# Altium schematic symbol library jlcpcb_2025_04_capacitors_extended_0402.schlib: 3594 symbols (part 19 of 20) (continued)
## TCC0402X7R223M250AT
designator C?  Capacitance: 22000pF  (hidden comment: *)
Capacitor, Ceramic (MLCC), 22000pF, ±20%, 25V, X7R, ±20%, SMD 0402; Manufacturer: CCTC; Manufacturer Part Number: TCC0402X7R223M250AT; Package Size: 0402; JLCPCB Basic Part: No; JLCPCB Part Number: C5142570; Supplier 1: LCSC; Category: Capacitors - MLCC; Supplier Part Number 1: C5142570; Tolerance: ±20%; Voltage Rating: 25V; Temperature Coefficient: X7R; RoHS: Yes; ComponentLink1Description: Datasheet; ComponentLink1URL: https://wmsc.lcsc.com/wmsc/upload/file/pdf/v2/lcsc/2209011730_CCTC-TCC0402X7R223M250AT_C5142570.pdf; ComponentLink2Description: JLCPCB Part URL; ComponentLink2URL: https://jlcpcb.com/partdetail/C5142570; ComponentLink3Description: LCSC Part URL; ComponentLink3URL: https://lcsc.com/product-detail/Multilayer-Ceramic-Capacitors-MLCC---SMD-SMT_CCTC-CCTC-TCC0402X7R223M250AT_C5142570.html
footprint CAP-0402 (0402 (1005M) Capacitor)
pins: 1, 2

## TCC0402X7R224K160AT
designator C?  Capacitance: 220nF  (hidden comment: *)
Capacitor, Ceramic (MLCC), 220nF, ±10%, 16V, X7R, ±10%, SMD 0402; Manufacturer: CCTC; Manufacturer Part Number: TCC0402X7R224K160AT; Package Size: 0402; JLCPCB Basic Part: No; JLCPCB Part Number: C696846; Supplier 1: LCSC; Category: Capacitors - MLCC; Supplier Part Number 1: C696846; Tolerance: ±10%; Voltage Rating: 16V; Temperature Coefficient: X7R; RoHS: Yes; ComponentLink1Description: Datasheet; ComponentLink1URL: https://wmsc.lcsc.com/wmsc/upload/file/pdf/v2/lcsc/2304140030_CCTC-TCC0402X7R224K160AT_C696846.pdf; ComponentLink2Description: JLCPCB Part URL; ComponentLink2URL: https://jlcpcb.com/partdetail/C696846; ComponentLink3Description: LCSC Part URL; ComponentLink3URL: https://lcsc.com/product-detail/Multilayer-Ceramic-Capacitors-MLCC---SMD-SMT_CCTC-CCTC-TCC0402X7R224K160AT_C696846.html
footprint CAP-0402 (0402 (1005M) Capacitor)
pins: 1, 2

## TCC0402X7R224K250AT
designator C?  Capacitance: 220000pF  (hidden comment: *)
Capacitor, Ceramic (MLCC), 220000pF, ±10%, 25V, X7R, ±10%, SMD 0402; Manufacturer: CCTC; Manufacturer Part Number: TCC0402X7R224K250AT; Package Size: 0402; JLCPCB Basic Part: No; JLCPCB Part Number: C915854; Supplier 1: LCSC; Category: Capacitors - MLCC; Supplier Part Number 1: C915854; Tolerance: ±10%; Voltage Rating: 25V; Temperature Coefficient: X7R; RoHS: Yes; ComponentLink1Description: Datasheet; ComponentLink1URL: https://wmsc.lcsc.com/wmsc/upload/file/pdf/v2/lcsc/2304140030_CCTC-TCC0402X7R224K250AT_C915854.pdf; ComponentLink2Description: JLCPCB Part URL; ComponentLink2URL: https://jlcpcb.com/partdetail/C915854; ComponentLink3Description: LCSC Part URL; ComponentLink3URL: https://lcsc.com/product-detail/Multilayer-Ceramic-Capacitors-MLCC---SMD-SMT_CCTC-CCTC-TCC0402X7R224K250AT_C915854.html
footprint CAP-0402 (0402 (1005M) Capacitor)
pins: 1, 2

## TCC0402X7R224M160AT
designator C?  Capacitance: 220nF  (hidden comment: *)
Capacitor, Ceramic (MLCC), 220nF, ±20%, 16V, X7R, ±20%, SMD 0402; Manufacturer: CCTC; Manufacturer Part Number: TCC0402X7R224M160AT; Package Size: 0402; JLCPCB Basic Part: No; JLCPCB Part Number: C2903665; Supplier 1: LCSC; Category: Capacitors - MLCC; Supplier Part Number 1: C2903665; Tolerance: ±20%; Voltage Rating: 16V; Temperature Coefficient: X7R; RoHS: Yes; ComponentLink1Description: Datasheet; ComponentLink1URL: https://wmsc.lcsc.com/wmsc/upload/file/pdf/v2/lcsc/2110101130_CCTC-TCC0402X7R224M160AT_C2903665.pdf; ComponentLink2Description: JLCPCB Part URL; ComponentLink2URL: https://jlcpcb.com/partdetail/C2903665; ComponentLink3Description: LCSC Part URL; ComponentLink3URL: https://lcsc.com/product-detail/Multilayer-Ceramic-Capacitors-MLCC---SMD-SMT_CCTC-CCTC-TCC0402X7R224M160AT_C2903665.html
footprint CAP-0402 (0402 (1005M) Capacitor)
pins: 1, 2

## TCC0402X7R271K500AT
designator C?  Capacitance: 270pF  (hidden comment: *)
Capacitor, Ceramic (MLCC), 270pF, ±10%, 50V, X7R, ±10%, SMD 0402; Manufacturer: CCTC; Manufacturer Part Number: TCC0402X7R271K500AT; Package Size: 0402; JLCPCB Basic Part: No; JLCPCB Part Number: C880627; Supplier 1: LCSC; Category: Capacitors - MLCC; Supplier Part Number 1: C880627; Tolerance: ±10%; Voltage Rating: 50V; Temperature Coefficient: X7R; RoHS: Yes; ComponentLink1Description: Datasheet; ComponentLink1URL: https://wmsc.lcsc.com/wmsc/upload/file/pdf/v2/lcsc/2304140030_CCTC-TCC0402X7R271K500AT_C880627.pdf; ComponentLink2Description: JLCPCB Part URL; ComponentLink2URL: https://jlcpcb.com/partdetail/C880627; ComponentLink3Description: LCSC Part URL; ComponentLink3URL: https://lcsc.com/product-detail/Multilayer-Ceramic-Capacitors-MLCC---SMD-SMT_CCTC-CCTC-TCC0402X7R271K500AT_C880627.html
footprint CAP-0402 (0402 (1005M) Capacitor)
pins: 1, 2

## TCC0402X7R272K500AT
designator C?  Capacitance: 2.7nF  (hidden comment: *)
Capacitor, Ceramic (MLCC), 2.7nF, ±10%, 50V, X7R, ±10%, SMD 0402; Manufacturer: CCTC; Manufacturer Part Number: TCC0402X7R272K500AT; Package Size: 0402; JLCPCB Basic Part: No; JLCPCB Part Number: C5448825; Supplier 1: LCSC; Category: Capacitors - MLCC; Supplier Part Number 1: C5448825; Tolerance: ±10%; Voltage Rating: 50V; Temperature Coefficient: X7R; RoHS: Yes; ComponentLink1Description: Datasheet; ComponentLink1URL: https://wmsc.lcsc.com/wmsc/upload/file/pdf/v2/lcsc/2403281711_CCTC-TCC0402X7R272K500AT_C5448825.pdf; ComponentLink2Description: JLCPCB Part URL; ComponentLink2URL: https://jlcpcb.com/partdetail/C5448825; ComponentLink3Description: LCSC Part URL; ComponentLink3URL: https://lcsc.com/product-detail/Multilayer-Ceramic-Capacitors-MLCC---SMD-SMT_CCTC-CCTC-TCC0402X7R272K500AT_C5448825.html
footprint CAP-0402 (0402 (1005M) Capacitor)
pins: 1, 2

## TCC0402X7R273K500AT
designator C?  Capacitance: 27000pF  (hidden comment: *)
Capacitor, Ceramic (MLCC), 27000pF, ±10%, 50V, X7R, ±10%, SMD 0402; Manufacturer: CCTC; Manufacturer Part Number: TCC0402X7R273K500AT; Package Size: 0402; JLCPCB Basic Part: No; JLCPCB Part Number: C880636; Supplier 1: LCSC; Category: Capacitors - MLCC; Supplier Part Number 1: C880636; Tolerance: ±10%; Voltage Rating: 50V; Temperature Coefficient: X7R; RoHS: Yes; ComponentLink1Description: Datasheet; ComponentLink1URL: https://wmsc.lcsc.com/wmsc/upload/file/pdf/v2/lcsc/2304140030_CCTC-TCC0402X7R273K500AT_C880636.pdf; ComponentLink2Description: JLCPCB Part URL; ComponentLink2URL: https://jlcpcb.com/partdetail/C880636; ComponentLink3Description: LCSC Part URL; ComponentLink3URL: https://lcsc.com/product-detail/Multilayer-Ceramic-Capacitors-MLCC---SMD-SMT_CCTC-CCTC-TCC0402X7R273K500AT_C880636.html
footprint CAP-0402 (0402 (1005M) Capacitor)
pins: 1, 2

## TCC0402X7R331K500AT
designator C?  Capacitance: 330pF  (hidden comment: *)
Capacitor, Ceramic (MLCC), 330pF, ±10%, 50V, X7R, ±10%, SMD 0402; Manufacturer: CCTC; Manufacturer Part Number: TCC0402X7R331K500AT; Package Size: 0402; JLCPCB Basic Part: No; JLCPCB Part Number: C696848; Supplier 1: LCSC; Category: Capacitors - MLCC; Supplier Part Number 1: C696848; Tolerance: ±10%; Voltage Rating: 50V; Temperature Coefficient: X7R; RoHS: Yes; ComponentLink1Description: Datasheet; ComponentLink1URL: https://wmsc.lcsc.com/wmsc/upload/file/pdf/v2/lcsc/2304140030_CCTC-TCC0402X7R331K500AT_C696848.pdf; ComponentLink2Description: JLCPCB Part URL; ComponentLink2URL: https://jlcpcb.com/partdetail/C696848; ComponentLink3Description: LCSC Part URL; ComponentLink3URL: https://lcsc.com/product-detail/Multilayer-Ceramic-Capacitors-MLCC---SMD-SMT_CCTC-CCTC-TCC0402X7R331K500AT_C696848.html
footprint CAP-0402 (0402 (1005M) Capacitor)
pins: 1, 2

## TCC0402X7R332K500AT
designator C?  Capacitance: 3.3nF  (hidden comment: *)
Capacitor, Ceramic (MLCC), 3.3nF, ±10%, 50V, X7R, ±10%, SMD 0402; Manufacturer: CCTC; Manufacturer Part Number: TCC0402X7R332K500AT; Package Size: 0402; JLCPCB Basic Part: No; JLCPCB Part Number: C696855; Supplier 1: LCSC; Category: Capacitors - MLCC; Supplier Part Number 1: C696855; Tolerance: ±10%; Voltage Rating: 50V; Temperature Coefficient: X7R; RoHS: Yes; ComponentLink1Description: Datasheet; ComponentLink1URL: https://wmsc.lcsc.com/wmsc/upload/file/pdf/v2/lcsc/2304140030_CCTC-TCC0402X7R332K500AT_C696855.pdf; ComponentLink2Description: JLCPCB Part URL; ComponentLink2URL: https://jlcpcb.com/partdetail/C696855; ComponentLink3Description: LCSC Part URL; ComponentLink3URL: https://lcsc.com/product-detail/Multilayer-Ceramic-Capacitors-MLCC---SMD-SMT_CCTC-CCTC-TCC0402X7R332K500AT_C696855.html
footprint CAP-0402 (0402 (1005M) Capacitor)
pins: 1, 2

## TCC0402X7R333K250AT
designator C?  Capacitance: 33nF  (hidden comment: *)
Capacitor, Ceramic (MLCC), 33nF, ±10%, 25V, X7R, ±10%, SMD 0402; Manufacturer: CCTC; Manufacturer Part Number: TCC0402X7R333K250AT; Package Size: 0402; JLCPCB Basic Part: No; JLCPCB Part Number: C466238; Supplier 1: LCSC; Category: Capacitors - MLCC; Supplier Part Number 1: C466238; Tolerance: ±10%; Voltage Rating: 25V; Temperature Coefficient: X7R; RoHS: Yes; ComponentLink1Description: Datasheet; ComponentLink1URL: https://wmsc.lcsc.com/wmsc/upload/file/pdf/v2/lcsc/2304140030_CCTC-TCC0402X7R333K250AT_C466238.pdf; ComponentLink2Description: JLCPCB Part URL; ComponentLink2URL: https://jlcpcb.com/partdetail/C466238; ComponentLink3Description: LCSC Part URL; ComponentLink3URL: https://lcsc.com/product-detail/Multilayer-Ceramic-Capacitors-MLCC---SMD-SMT_CCTC-CCTC-TCC0402X7R333K250AT_C466238.html
footprint CAP-0402 (0402 (1005M) Capacitor)
pins: 1, 2

## TCC0402X7R333K500AT
designator C?  Capacitance: 33000pF  (hidden comment: *)
Capacitor, Ceramic (MLCC), 33000pF, ±10%, 50V, X7R, ±10%, SMD 0402; Manufacturer: CCTC; Manufacturer Part Number: TCC0402X7R333K500AT; Package Size: 0402; JLCPCB Basic Part: No; JLCPCB Part Number: C880608; Supplier 1: LCSC; Category: Capacitors - MLCC; Supplier Part Number 1: C880608; Tolerance: ±10%; Voltage Rating: 50V; Temperature Coefficient: X7R; RoHS: Yes; ComponentLink1Description: Datasheet; ComponentLink1URL: https://wmsc.lcsc.com/wmsc/upload/file/pdf/v2/lcsc/2304140030_CCTC-TCC0402X7R333K500AT_C880608.pdf; ComponentLink2Description: JLCPCB Part URL; ComponentLink2URL: https://jlcpcb.com/partdetail/C880608; ComponentLink3Description: LCSC Part URL; ComponentLink3URL: https://lcsc.com/product-detail/Multilayer-Ceramic-Capacitors-MLCC---SMD-SMT_CCTC-CCTC-TCC0402X7R333K500AT_C880608.html
footprint CAP-0402 (0402 (1005M) Capacitor)
pins: 1, 2

## TCC0402X7R333M250AT
designator C?  Capacitance: 33nF  (hidden comment: *)
Capacitor, Ceramic (MLCC), 33nF, ±20%, 25V, X7R, ±20%, SMD 0402; Manufacturer: CCTC; Manufacturer Part Number: TCC0402X7R333M250AT; Package Size: 0402; JLCPCB Basic Part: No; JLCPCB Part Number: C6266888; Supplier 1: LCSC; Category: Capacitors - MLCC; Supplier Part Number 1: C6266888; Tolerance: ±20%; Voltage Rating: 25V; Temperature Coefficient: X7R; RoHS: Yes; ComponentLink1Description: Datasheet; ComponentLink1URL: https://wmsc.lcsc.com/wmsc/upload/file/pdf/v2/lcsc/2305171520_CCTC-TCC0402X7R333M250AT_C6266888.pdf; ComponentLink2Description: JLCPCB Part URL; ComponentLink2URL: https://jlcpcb.com/partdetail/C6266888; ComponentLink3Description: LCSC Part URL; ComponentLink3URL: https://lcsc.com/product-detail/Multilayer-Ceramic-Capacitors-MLCC---SMD-SMT_CCTC-CCTC-TCC0402X7R333M250AT_C6266888.html
footprint CAP-0402 (0402 (1005M) Capacitor)
pins: 1, 2

## TCC0402X7R361K500AT
designator C?  Capacitance: 360pF  (hidden comment: *)
Capacitor, Ceramic (MLCC), 360pF, ±10%, 50V, X7R, ±10%, SMD 0402; Manufacturer: CCTC; Manufacturer Part Number: TCC0402X7R361K500AT; Package Size: 0402; JLCPCB Basic Part: No; JLCPCB Part Number: C7393871; Supplier 1: LCSC; Category: Capacitors - MLCC; Supplier Part Number 1: C7393871; Tolerance: ±10%; Voltage Rating: 50V; Temperature Coefficient: X7R; RoHS: Yes; ComponentLink1Description: Datasheet; ComponentLink1URL: https://wmsc.lcsc.com/wmsc/upload/file/pdf/v2/lcsc/2306211554_CCTC-TCC0402X7R361K500AT_C7393871.pdf; ComponentLink2Description: JLCPCB Part URL; ComponentLink2URL: https://jlcpcb.com/partdetail/C7393871; ComponentLink3Description: LCSC Part URL; ComponentLink3URL: https://lcsc.com/product-detail/Multilayer-Ceramic-Capacitors-MLCC---SMD-SMT_CCTC-CCTC-TCC0402X7R361K500AT_C7393871.html
footprint CAP-0402 (0402 (1005M) Capacitor)
pins: 1, 2

## TCC0402X7R391K500AT
designator C?  Capacitance: 390pF  (hidden comment: *)
Capacitor, Ceramic (MLCC), 390pF, ±10%, 50V, X7R, ±10%, SMD 0402; Manufacturer: CCTC; Manufacturer Part Number: TCC0402X7R391K500AT; Package Size: 0402; JLCPCB Basic Part: No; JLCPCB Part Number: C696902; Supplier 1: LCSC; Category: Capacitors - MLCC; Supplier Part Number 1: C696902; Tolerance: ±10%; Voltage Rating: 50V; Temperature Coefficient: X7R; RoHS: Yes; ComponentLink1Description: Datasheet; ComponentLink1URL: https://wmsc.lcsc.com/wmsc/upload/file/pdf/v2/lcsc/2304140030_CCTC-TCC0402X7R391K500AT_C696902.pdf; ComponentLink2Description: JLCPCB Part URL; ComponentLink2URL: https://jlcpcb.com/partdetail/C696902; ComponentLink3Description: LCSC Part URL; ComponentLink3URL: https://lcsc.com/product-detail/Multilayer-Ceramic-Capacitors-MLCC---SMD-SMT_CCTC-CCTC-TCC0402X7R391K500AT_C696902.html
footprint CAP-0402 (0402 (1005M) Capacitor)
pins: 1, 2

## TCC0402X7R392K500AT
designator C?  Capacitance: 3900pF  (hidden comment: *)
Capacitor, Ceramic (MLCC), 3900pF, ±10%, 50V, X7R, ±10%, SMD 0402; Manufacturer: CCTC; Manufacturer Part Number: TCC0402X7R392K500AT; Package Size: 0402; JLCPCB Basic Part: No; JLCPCB Part Number: C880632; Supplier 1: LCSC; Category: Capacitors - MLCC; Supplier Part Number 1: C880632; Tolerance: ±10%; Voltage Rating: 50V; Temperature Coefficient: X7R; RoHS: Yes; ComponentLink1Description: Datasheet; ComponentLink1URL: https://wmsc.lcsc.com/wmsc/upload/file/pdf/v2/lcsc/2304140030_CCTC-TCC0402X7R392K500AT_C880632.pdf; ComponentLink2Description: JLCPCB Part URL; ComponentLink2URL: https://jlcpcb.com/partdetail/C880632; ComponentLink3Description: LCSC Part URL; ComponentLink3URL: https://lcsc.com/product-detail/Multilayer-Ceramic-Capacitors-MLCC---SMD-SMT_CCTC-CCTC-TCC0402X7R392K500AT_C880632.html
footprint CAP-0402 (0402 (1005M) Capacitor)
pins: 1, 2

## TCC0402X7R393K500AT
designator C?  Capacitance: 39nF  (hidden comment: *)
Capacitor, Ceramic (MLCC), 39nF, ±10%, 50V, X7R, ±10%, SMD 0402; Manufacturer: CCTC; Manufacturer Part Number: TCC0402X7R393K500AT; Package Size: 0402; JLCPCB Basic Part: No; JLCPCB Part Number: C880624; Supplier 1: LCSC; Category: Capacitors - MLCC; Supplier Part Number 1: C880624; Tolerance: ±10%; Voltage Rating: 50V; Temperature Coefficient: X7R; RoHS: Yes; ComponentLink1Description: Datasheet; ComponentLink1URL: https://wmsc.lcsc.com/wmsc/upload/file/pdf/v2/lcsc/2304140030_CCTC-TCC0402X7R393K500AT_C880624.pdf; ComponentLink2Description: JLCPCB Part URL; ComponentLink2URL: https://jlcpcb.com/partdetail/C880624; ComponentLink3Description: LCSC Part URL; ComponentLink3URL: https://lcsc.com/product-detail/Multilayer-Ceramic-Capacitors-MLCC---SMD-SMT_CCTC-CCTC-TCC0402X7R393K500AT_C880624.html
footprint CAP-0402 (0402 (1005M) Capacitor)
pins: 1, 2

## TCC0402X7R471K500AT
designator C?  Capacitance: 470pF  (hidden comment: *)
Capacitor, Ceramic (MLCC), 470pF, ±10%, 50V, X7R, ±10%, SMD 0402; Manufacturer: CCTC; Manufacturer Part Number: TCC0402X7R471K500AT; Package Size: 0402; JLCPCB Basic Part: No; JLCPCB Part Number: C696858; Supplier 1: LCSC; Category: Capacitors - MLCC; Supplier Part Number 1: C696858; Tolerance: ±10%; Voltage Rating: 50V; Temperature Coefficient: X7R; RoHS: Yes; ComponentLink1Description: Datasheet; ComponentLink1URL: https://wmsc.lcsc.com/wmsc/upload/file/pdf/v2/lcsc/2304140030_CCTC-TCC0402X7R471K500AT_C696858.pdf; ComponentLink2Description: JLCPCB Part URL; ComponentLink2URL: https://jlcpcb.com/partdetail/C696858; ComponentLink3Description: LCSC Part URL; ComponentLink3URL: https://lcsc.com/product-detail/Multilayer-Ceramic-Capacitors-MLCC---SMD-SMT_CCTC-CCTC-TCC0402X7R471K500AT_C696858.html
footprint CAP-0402 (0402 (1005M) Capacitor)
pins: 1, 2

## TCC0402X7R472K500AT
designator C?  Capacitance: 4.7nF  (hidden comment: *)
Capacitor, Ceramic (MLCC), 4.7nF, ±10%, 50V, X7R, ±10%, SMD 0402; Manufacturer: CCTC; Manufacturer Part Number: TCC0402X7R472K500AT; Package Size: 0402; JLCPCB Basic Part: No; JLCPCB Part Number: C696917; Supplier 1: LCSC; Category: Capacitors - MLCC; Supplier Part Number 1: C696917; Tolerance: ±10%; Voltage Rating: 50V; Temperature Coefficient: X7R; RoHS: Yes; ComponentLink1Description: Datasheet; ComponentLink1URL: https://wmsc.lcsc.com/wmsc/upload/file/pdf/v2/lcsc/2304140030_CCTC-TCC0402X7R472K500AT_C696917.pdf; ComponentLink2Description: JLCPCB Part URL; ComponentLink2URL: https://jlcpcb.com/partdetail/C696917; ComponentLink3Description: LCSC Part URL; ComponentLink3URL: https://lcsc.com/product-detail/Multilayer-Ceramic-Capacitors-MLCC---SMD-SMT_CCTC-CCTC-TCC0402X7R472K500AT_C696917.html
footprint CAP-0402 (0402 (1005M) Capacitor)
pins: 1, 2

## TCC0402X7R473K160AT
designator C?  Capacitance: 47nF  (hidden comment: *)
Capacitor, Ceramic (MLCC), 47nF, ±10%, 16V, X7R, ±10%, SMD 0402; Manufacturer: CCTC; Manufacturer Part Number: TCC0402X7R473K160AT; Package Size: 0402; JLCPCB Basic Part: No; JLCPCB Part Number: C380307; Supplier 1: LCSC; Category: Capacitors - MLCC; Supplier Part Number 1: C380307; Tolerance: ±10%; Voltage Rating: 16V; Temperature Coefficient: X7R; RoHS: Yes; ComponentLink1Description: Datasheet; ComponentLink1URL: https://wmsc.lcsc.com/wmsc/upload/file/pdf/v2/lcsc/2304140030_CCTC-TCC0402X7R473K160AT_C380307.pdf; ComponentLink2Description: JLCPCB Part URL; ComponentLink2URL: https://jlcpcb.com/partdetail/C380307; ComponentLink3Description: LCSC Part URL; ComponentLink3URL: https://lcsc.com/product-detail/Multilayer-Ceramic-Capacitors-MLCC---SMD-SMT_CCTC-CCTC-TCC0402X7R473K160AT_C380307.html
footprint CAP-0402 (0402 (1005M) Capacitor)
pins: 1, 2

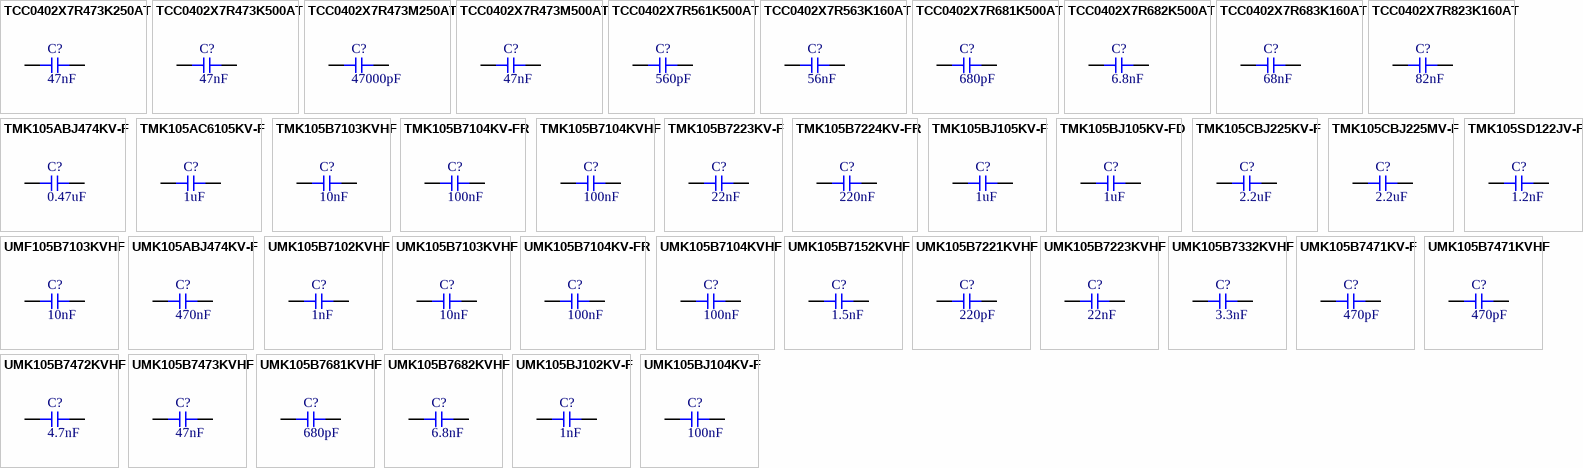
[diagram p85: symbols TCC0402X7R473K250AT to UMK105BJ104KV-F]

## TCC0402X7R473K250AT
designator C?  Capacitance: 47nF  (hidden comment: *)
Capacitor, Ceramic (MLCC), 47nF, ±10%, 25V, X7R, ±10%, SMD 0402; Manufacturer: CCTC; Manufacturer Part Number: TCC0402X7R473K250AT; Package Size: 0402; JLCPCB Basic Part: No; JLCPCB Part Number: C466239; Supplier 1: LCSC; Category: Capacitors - MLCC; Supplier Part Number 1: C466239; Tolerance: ±10%; Voltage Rating: 25V; Temperature Coefficient: X7R; RoHS: Yes; ComponentLink1Description: Datasheet; ComponentLink1URL: https://wmsc.lcsc.com/wmsc/upload/file/pdf/v2/lcsc/2304140030_CCTC-TCC0402X7R473K250AT_C466239.pdf; ComponentLink2Description: JLCPCB Part URL; ComponentLink2URL: https://jlcpcb.com/partdetail/C466239; ComponentLink3Description: LCSC Part URL; ComponentLink3URL: https://lcsc.com/product-detail/Multilayer-Ceramic-Capacitors-MLCC---SMD-SMT_CCTC-CCTC-TCC0402X7R473K250AT_C466239.html
footprint CAP-0402 (0402 (1005M) Capacitor)
pins: 1, 2

## TCC0402X7R473K500AT
designator C?  Capacitance: 47nF  (hidden comment: *)
Capacitor, Ceramic (MLCC), 47nF, ±10%, 50V, X7R, ±10%, SMD 0402; Manufacturer: CCTC; Manufacturer Part Number: TCC0402X7R473K500AT; Package Size: 0402; JLCPCB Basic Part: No; JLCPCB Part Number: C880605; Supplier 1: LCSC; Category: Capacitors - MLCC; Supplier Part Number 1: C880605; Tolerance: ±10%; Voltage Rating: 50V; Temperature Coefficient: X7R; RoHS: Yes; ComponentLink1Description: Datasheet; ComponentLink1URL: https://wmsc.lcsc.com/wmsc/upload/file/pdf/v2/lcsc/2304140030_CCTC-TCC0402X7R473K500AT_C880605.pdf; ComponentLink2Description: JLCPCB Part URL; ComponentLink2URL: https://jlcpcb.com/partdetail/C880605; ComponentLink3Description: LCSC Part URL; ComponentLink3URL: https://lcsc.com/product-detail/Multilayer-Ceramic-Capacitors-MLCC---SMD-SMT_CCTC-CCTC-TCC0402X7R473K500AT_C880605.html
footprint CAP-0402 (0402 (1005M) Capacitor)
pins: 1, 2

## TCC0402X7R473M250AT
designator C?  Capacitance: 47000pF  (hidden comment: *)
Capacitor, Ceramic (MLCC), 47000pF, ±20%, 25V, X7R, ±20%, SMD 0402; Manufacturer: CCTC; Manufacturer Part Number: TCC0402X7R473M250AT; Package Size: 0402; JLCPCB Basic Part: No; JLCPCB Part Number: C5142571; Supplier 1: LCSC; Category: Capacitors - MLCC; Supplier Part Number 1: C5142571; Tolerance: ±20%; Voltage Rating: 25V; Temperature Coefficient: X7R; RoHS: Yes; ComponentLink1Description: Datasheet; ComponentLink1URL: https://wmsc.lcsc.com/wmsc/upload/file/pdf/v2/lcsc/2209011730_CCTC-TCC0402X7R473M250AT_C5142571.pdf; ComponentLink2Description: JLCPCB Part URL; ComponentLink2URL: https://jlcpcb.com/partdetail/C5142571; ComponentLink3Description: LCSC Part URL; ComponentLink3URL: https://lcsc.com/product-detail/Multilayer-Ceramic-Capacitors-MLCC---SMD-SMT_CCTC-CCTC-TCC0402X7R473M250AT_C5142571.html
footprint CAP-0402 (0402 (1005M) Capacitor)
pins: 1, 2

## TCC0402X7R473M500AT
designator C?  Capacitance: 47nF  (hidden comment: *)
Capacitor, Ceramic (MLCC), 47nF, ±20%, 50V, X7R, ±20%, SMD 0402; Manufacturer: CCTC; Manufacturer Part Number: TCC0402X7R473M500AT; Package Size: 0402; JLCPCB Basic Part: No; JLCPCB Part Number: C7393874; Supplier 1: LCSC; Category: Capacitors - MLCC; Supplier Part Number 1: C7393874; Tolerance: ±20%; Voltage Rating: 50V; Temperature Coefficient: X7R; RoHS: Yes; ComponentLink1Description: Datasheet; ComponentLink1URL: https://wmsc.lcsc.com/wmsc/upload/file/pdf/v2/lcsc/2306211554_CCTC-TCC0402X7R473M500AT_C7393874.pdf; ComponentLink2Description: JLCPCB Part URL; ComponentLink2URL: https://jlcpcb.com/partdetail/C7393874; ComponentLink3Description: LCSC Part URL; ComponentLink3URL: https://lcsc.com/product-detail/Multilayer-Ceramic-Capacitors-MLCC---SMD-SMT_CCTC-CCTC-TCC0402X7R473M500AT_C7393874.html
footprint CAP-0402 (0402 (1005M) Capacitor)
pins: 1, 2

## TCC0402X7R561K500AT
designator C?  Capacitance: 560pF  (hidden comment: *)
Capacitor, Ceramic (MLCC), 560pF, ±10%, 50V, X7R, ±10%, SMD 0402; Manufacturer: CCTC; Manufacturer Part Number: TCC0402X7R561K500AT; Package Size: 0402; JLCPCB Basic Part: No; JLCPCB Part Number: C5448816; Supplier 1: LCSC; Category: Capacitors - MLCC; Supplier Part Number 1: C5448816; Tolerance: ±10%; Voltage Rating: 50V; Temperature Coefficient: X7R; RoHS: Yes; ComponentLink1Description: Datasheet; ComponentLink1URL: https://wmsc.lcsc.com/wmsc/upload/file/pdf/v2/lcsc/2403281711_CCTC-TCC0402X7R561K500AT_C5448816.pdf; ComponentLink2Description: JLCPCB Part URL; ComponentLink2URL: https://jlcpcb.com/partdetail/C5448816; ComponentLink3Description: LCSC Part URL; ComponentLink3URL: https://lcsc.com/product-detail/Multilayer-Ceramic-Capacitors-MLCC---SMD-SMT_CCTC-CCTC-TCC0402X7R561K500AT_C5448816.html
footprint CAP-0402 (0402 (1005M) Capacitor)
pins: 1, 2

## TCC0402X7R563K160AT
designator C?  Capacitance: 56nF  (hidden comment: *)
Capacitor, Ceramic (MLCC), 56nF, ±10%, 16V, X7R, ±10%, SMD 0402; Manufacturer: CCTC; Manufacturer Part Number: TCC0402X7R563K160AT; Package Size: 0402; JLCPCB Basic Part: No; JLCPCB Part Number: C380308; Supplier 1: LCSC; Category: Capacitors - MLCC; Supplier Part Number 1: C380308; Tolerance: ±10%; Voltage Rating: 16V; Temperature Coefficient: X7R; RoHS: Yes; ComponentLink1Description: Datasheet; ComponentLink1URL: https://wmsc.lcsc.com/wmsc/upload/file/pdf/v2/lcsc/2304140030_CCTC-TCC0402X7R563K160AT_C380308.pdf; ComponentLink2Description: JLCPCB Part URL; ComponentLink2URL: https://jlcpcb.com/partdetail/C380308; ComponentLink3Description: LCSC Part URL; ComponentLink3URL: https://lcsc.com/product-detail/Multilayer-Ceramic-Capacitors-MLCC---SMD-SMT_CCTC-CCTC-TCC0402X7R563K160AT_C380308.html
footprint CAP-0402 (0402 (1005M) Capacitor)
pins: 1, 2

## TCC0402X7R681K500AT
designator C?  Capacitance: 680pF  (hidden comment: *)
Capacitor, Ceramic (MLCC), 680pF, ±10%, 50V, X7R, ±10%, SMD 0402; Manufacturer: CCTC; Manufacturer Part Number: TCC0402X7R681K500AT; Package Size: 0402; JLCPCB Basic Part: No; JLCPCB Part Number: C696914; Supplier 1: LCSC; Category: Capacitors - MLCC; Supplier Part Number 1: C696914; Tolerance: ±10%; Voltage Rating: 50V; Temperature Coefficient: X7R; RoHS: Yes; ComponentLink1Description: Datasheet; ComponentLink1URL: https://wmsc.lcsc.com/wmsc/upload/file/pdf/v2/lcsc/2304140030_CCTC-TCC0402X7R681K500AT_C696914.pdf; ComponentLink2Description: JLCPCB Part URL; ComponentLink2URL: https://jlcpcb.com/partdetail/C696914; ComponentLink3Description: LCSC Part URL; ComponentLink3URL: https://lcsc.com/product-detail/Multilayer-Ceramic-Capacitors-MLCC---SMD-SMT_CCTC-CCTC-TCC0402X7R681K500AT_C696914.html
footprint CAP-0402 (0402 (1005M) Capacitor)
pins: 1, 2

## TCC0402X7R682K500AT
designator C?  Capacitance: 6.8nF  (hidden comment: *)
Capacitor, Ceramic (MLCC), 6.8nF, ±10%, 50V, X7R, ±10%, SMD 0402; Manufacturer: CCTC; Manufacturer Part Number: TCC0402X7R682K500AT; Package Size: 0402; JLCPCB Basic Part: No; JLCPCB Part Number: C2760541; Supplier 1: LCSC; Category: Capacitors - MLCC; Supplier Part Number 1: C2760541; Tolerance: ±10%; Voltage Rating: 50V; Temperature Coefficient: X7R; RoHS: Yes; ComponentLink1Description: Datasheet; ComponentLink1URL: https://wmsc.lcsc.com/wmsc/upload/file/pdf/v2/lcsc/2304140030_CCTC-TCC0402X7R682K500AT_C2760541.pdf; ComponentLink2Description: JLCPCB Part URL; ComponentLink2URL: https://jlcpcb.com/partdetail/C2760541; ComponentLink3Description: LCSC Part URL; ComponentLink3URL: https://lcsc.com/product-detail/Multilayer-Ceramic-Capacitors-MLCC---SMD-SMT_CCTC-CCTC-TCC0402X7R682K500AT_C2760541.html
footprint CAP-0402 (0402 (1005M) Capacitor)
pins: 1, 2

## TCC0402X7R683K160AT
designator C?  Capacitance: 68nF  (hidden comment: *)
Capacitor, Ceramic (MLCC), 68nF, ±10%, 16V, X7R, ±10%, SMD 0402; Manufacturer: CCTC; Manufacturer Part Number: TCC0402X7R683K160AT; Package Size: 0402; JLCPCB Basic Part: No; JLCPCB Part Number: C380309; Supplier 1: LCSC; Category: Capacitors - MLCC; Supplier Part Number 1: C380309; Tolerance: ±10%; Voltage Rating: 16V; Temperature Coefficient: X7R; RoHS: Yes; ComponentLink1Description: Datasheet; ComponentLink1URL: https://wmsc.lcsc.com/wmsc/upload/file/pdf/v2/lcsc/2304140030_CCTC-TCC0402X7R683K160AT_C380309.pdf; ComponentLink2Description: JLCPCB Part URL; ComponentLink2URL: https://jlcpcb.com/partdetail/C380309; ComponentLink3Description: LCSC Part URL; ComponentLink3URL: https://lcsc.com/product-detail/Multilayer-Ceramic-Capacitors-MLCC---SMD-SMT_CCTC-CCTC-TCC0402X7R683K160AT_C380309.html
footprint CAP-0402 (0402 (1005M) Capacitor)
pins: 1, 2

## TCC0402X7R823K160AT
designator C?  Capacitance: 82nF  (hidden comment: *)
Capacitor, Ceramic (MLCC), 82nF, ±10%, 16V, X7R, ±10%, SMD 0402; Manufacturer: CCTC; Manufacturer Part Number: TCC0402X7R823K160AT; Package Size: 0402; JLCPCB Basic Part: No; JLCPCB Part Number: C380310; Supplier 1: LCSC; Category: Capacitors - MLCC; Supplier Part Number 1: C380310; Tolerance: ±10%; Voltage Rating: 16V; Temperature Coefficient: X7R; RoHS: Yes; ComponentLink1Description: Datasheet; ComponentLink1URL: https://wmsc.lcsc.com/wmsc/upload/file/pdf/v2/lcsc/2304140030_CCTC-TCC0402X7R823K160AT_C380310.pdf; ComponentLink2Description: JLCPCB Part URL; ComponentLink2URL: https://jlcpcb.com/partdetail/C380310; ComponentLink3Description: LCSC Part URL; ComponentLink3URL: https://lcsc.com/product-detail/Multilayer-Ceramic-Capacitors-MLCC---SMD-SMT_CCTC-CCTC-TCC0402X7R823K160AT_C380310.html
footprint CAP-0402 (0402 (1005M) Capacitor)
pins: 1, 2

## TMK105ABJ474KV-F
designator C?  Capacitance: 0.47uF  (hidden comment: *)
Capacitor, Ceramic (MLCC), 0.47uF, ±10%, 25V, X5R, ±10%, SMD 0402; Manufacturer: Taiyo Yuden; Manufacturer Part Number: TMK105ABJ474KV-F; Package Size: 0402; JLCPCB Basic Part: No; JLCPCB Part Number: C778725; Supplier 1: LCSC; Category: Capacitors - MLCC; Supplier Part Number 1: C778725; Tolerance: ±10%; Voltage Rating: 25V; Temperature Coefficient: X5R; RoHS: Yes; ComponentLink1Description: Datasheet; ComponentLink1URL: https://wmsc.lcsc.com/wmsc/upload/file/pdf/v2/lcsc/2211282200_Taiyo-Yuden-TMK105ABJ474KV-F_C778725.pdf; ComponentLink2Description: JLCPCB Part URL; ComponentLink2URL: https://jlcpcb.com/partdetail/C778725; ComponentLink3Description: LCSC Part URL; ComponentLink3URL: https://lcsc.com/product-detail/Multilayer-Ceramic-Capacitors-MLCC---SMD-SMT_Taiyo-Yuden-Taiyo-Yuden-TMK105ABJ474KV-F_C778725.html
footprint CAP-0402 (0402 (1005M) Capacitor)
pins: 1, 2

## TMK105AC6105KV-F
designator C?  Capacitance: 1uF  (hidden comment: *)
Capacitor, Ceramic (MLCC), 1uF, ±10%, 25V, X6S, ±10%, SMD 0402; Manufacturer: Taiyo Yuden; Manufacturer Part Number: TMK105AC6105KV-F; Package Size: 0402; JLCPCB Basic Part: No; JLCPCB Part Number: C2169575; Supplier 1: LCSC; Category: Capacitors - MLCC; Supplier Part Number 1: C2169575; Tolerance: ±10%; Voltage Rating: 25V; Temperature Coefficient: X6S; RoHS: Yes; ComponentLink1Description: Datasheet; ComponentLink1URL: https://wmsc.lcsc.com/wmsc/upload/file/pdf/v2/lcsc/2211282030_Taiyo-Yuden-TMK105AC6105KV-F_C2169575.pdf; ComponentLink2Description: JLCPCB Part URL; ComponentLink2URL: https://jlcpcb.com/partdetail/C2169575; ComponentLink3Description: LCSC Part URL; ComponentLink3URL: https://lcsc.com/product-detail/Multilayer-Ceramic-Capacitors-MLCC---SMD-SMT_Taiyo-Yuden-Taiyo-Yuden-TMK105AC6105KV-F_C2169575.html
footprint CAP-0402 (0402 (1005M) Capacitor)
pins: 1, 2

## TMK105B7103KVHF
designator C?  Capacitance: 10nF  (hidden comment: *)
Capacitor, Ceramic (MLCC), 10nF, ±10%, 25V, X7R, ±10%, SMD 0402; Manufacturer: Taiyo Yuden; Manufacturer Part Number: TMK105B7103KVHF; Package Size: 0402; JLCPCB Basic Part: No; JLCPCB Part Number: C650944; Supplier 1: LCSC; Category: Capacitors - MLCC; Supplier Part Number 1: C650944; Tolerance: ±10%; Voltage Rating: 25V; Temperature Coefficient: X7R; RoHS: Yes; ComponentLink1Description: Datasheet; ComponentLink1URL: https://wmsc.lcsc.com/wmsc/upload/file/pdf/v2/lcsc/2304140030_Taiyo-Yuden-TMK105B7103KVHF_C650944.pdf; ComponentLink2Description: JLCPCB Part URL; ComponentLink2URL: https://jlcpcb.com/partdetail/C650944; ComponentLink3Description: LCSC Part URL; ComponentLink3URL: https://lcsc.com/product-detail/Multilayer-Ceramic-Capacitors-MLCC---SMD-SMT_Taiyo-Yuden-Taiyo-Yuden-TMK105B7103KVHF_C650944.html
footprint CAP-0402 (0402 (1005M) Capacitor)
pins: 1, 2

## TMK105B7104KV-FR
designator C?  Capacitance: 100nF  (hidden comment: *)
Capacitor, Ceramic (MLCC), 100nF, ±10%, 25V, X7R, ±10%, SMD 0402; Manufacturer: Taiyo Yuden; Manufacturer Part Number: TMK105B7104KV-FR; Package Size: 0402; JLCPCB Basic Part: No; JLCPCB Part Number: C2176388; Supplier 1: LCSC; Category: Capacitors - MLCC; Supplier Part Number 1: C2176388; Tolerance: ±10%; Voltage Rating: 25V; Temperature Coefficient: X7R; RoHS: Yes; ComponentLink1Description: Datasheet; ComponentLink1URL: https://wmsc.lcsc.com/wmsc/upload/file/pdf/v2/lcsc/2309051409_Taiyo-Yuden-TMK105B7104KV-FR_C2176388.pdf; ComponentLink2Description: JLCPCB Part URL; ComponentLink2URL: https://jlcpcb.com/partdetail/C2176388; ComponentLink3Description: LCSC Part URL; ComponentLink3URL: https://lcsc.com/product-detail/Multilayer-Ceramic-Capacitors-MLCC---SMD-SMT_Taiyo-Yuden-Taiyo-Yuden-TMK105B7104KV-FR_C2176388.html
footprint CAP-0402 (0402 (1005M) Capacitor)
pins: 1, 2

## TMK105B7104KVHF
designator C?  Capacitance: 100nF  (hidden comment: *)
Capacitor, Ceramic (MLCC), 100nF, ±10%, 25V, X7R, ±10%, SMD 0402; Manufacturer: Taiyo Yuden; Manufacturer Part Number: TMK105B7104KVHF; Package Size: 0402; JLCPCB Basic Part: No; JLCPCB Part Number: C386075; Supplier 1: LCSC; Category: Capacitors - MLCC; Supplier Part Number 1: C386075; Tolerance: ±10%; Voltage Rating: 25V; Temperature Coefficient: X7R; RoHS: Yes; ComponentLink1Description: Datasheet; ComponentLink1URL: https://wmsc.lcsc.com/wmsc/upload/file/pdf/v2/lcsc/2304140030_Taiyo-Yuden-TMK105B7104KVHF_C386075.pdf; ComponentLink2Description: JLCPCB Part URL; ComponentLink2URL: https://jlcpcb.com/partdetail/C386075; ComponentLink3Description: LCSC Part URL; ComponentLink3URL: https://lcsc.com/product-detail/Multilayer-Ceramic-Capacitors-MLCC---SMD-SMT_Taiyo-Yuden-Taiyo-Yuden-TMK105B7104KVHF_C386075.html
footprint CAP-0402 (0402 (1005M) Capacitor)
pins: 1, 2

## TMK105B7223KV-F
designator C?  Capacitance: 22nF  (hidden comment: *)
Capacitor, Ceramic (MLCC), 22nF, ±10%, 25V, X7R, ±10%, SMD 0402; Manufacturer: Taiyo Yuden; Manufacturer Part Number: TMK105B7223KV-F; Package Size: 0402; JLCPCB Basic Part: No; JLCPCB Part Number: C386076; Supplier 1: LCSC; Category: Capacitors - MLCC; Supplier Part Number 1: C386076; Tolerance: ±10%; Voltage Rating: 25V; Temperature Coefficient: X7R; RoHS: Yes; ComponentLink1Description: Datasheet; ComponentLink1URL: https://wmsc.lcsc.com/wmsc/upload/file/pdf/v2/lcsc/2304140030_Taiyo-Yuden-TMK105B7223KV-F_C386076.pdf; ComponentLink2Description: JLCPCB Part URL; ComponentLink2URL: https://jlcpcb.com/partdetail/C386076; ComponentLink3Description: LCSC Part URL; ComponentLink3URL: https://lcsc.com/product-detail/Multilayer-Ceramic-Capacitors-MLCC---SMD-SMT_Taiyo-Yuden-Taiyo-Yuden-TMK105B7223KV-F_C386076.html
footprint CAP-0402 (0402 (1005M) Capacitor)
pins: 1, 2

## TMK105B7224KV-FR
designator C?  Capacitance: 220nF  (hidden comment: *)
Capacitor, Ceramic (MLCC), 220nF, ±10%, 25V, X7R, ±10%, SMD 0402; Manufacturer: Taiyo Yuden; Manufacturer Part Number: TMK105B7224KV-FR; Package Size: 0402; JLCPCB Basic Part: No; JLCPCB Part Number: C841047; Supplier 1: LCSC; Category: Capacitors - MLCC; Supplier Part Number 1: C841047; Tolerance: ±10%; Voltage Rating: 25V; Temperature Coefficient: X7R; RoHS: Yes; ComponentLink1Description: Datasheet; ComponentLink1URL: https://wmsc.lcsc.com/wmsc/upload/file/pdf/v2/lcsc/2009251208_Taiyo-Yuden-TMK105B7224KV-FR_C841047.pdf; ComponentLink2Description: JLCPCB Part URL; ComponentLink2URL: https://jlcpcb.com/partdetail/C841047; ComponentLink3Description: LCSC Part URL; ComponentLink3URL: https://lcsc.com/product-detail/Multilayer-Ceramic-Capacitors-MLCC---SMD-SMT_Taiyo-Yuden-Taiyo-Yuden-TMK105B7224KV-FR_C841047.html
footprint CAP-0402 (0402 (1005M) Capacitor)
pins: 1, 2

## TMK105BJ105KV-F
designator C?  Capacitance: 1uF  (hidden comment: *)
Capacitor, Ceramic (MLCC), 1uF, ±10%, 25V, X5R, ±10%, SMD 0402; Manufacturer: Taiyo Yuden; Manufacturer Part Number: TMK105BJ105KV-F; Package Size: 0402; JLCPCB Basic Part: No; JLCPCB Part Number: C268023; Supplier 1: LCSC; Category: Capacitors - MLCC; Supplier Part Number 1: C268023; Tolerance: ±10%; Voltage Rating: 25V; Temperature Coefficient: X5R; RoHS: Yes; ComponentLink1Description: Datasheet; ComponentLink1URL: https://wmsc.lcsc.com/wmsc/upload/file/pdf/v2/lcsc/1811021222_Taiyo-Yuden-TMK105BJ105KV-F_C268023.pdf; ComponentLink2Description: JLCPCB Part URL; ComponentLink2URL: https://jlcpcb.com/partdetail/C268023; ComponentLink3Description: LCSC Part URL; ComponentLink3URL: https://lcsc.com/product-detail/Multilayer-Ceramic-Capacitors-MLCC---SMD-SMT_Taiyo-Yuden-Taiyo-Yuden-TMK105BJ105KV-F_C268023.html
footprint CAP-0402 (0402 (1005M) Capacitor)
pins: 1, 2

## TMK105BJ105KV-FD
designator C?  Capacitance: 1uF  (hidden comment: *)
Capacitor, Ceramic (MLCC), 1uF, ±10%, 25V, X5R, ±10%, SMD 0402; Manufacturer: Taiyo Yuden; Manufacturer Part Number: TMK105BJ105KV-FD; Package Size: 0402; JLCPCB Basic Part: No; JLCPCB Part Number: C2880408; Supplier 1: LCSC; Category: Capacitors - MLCC; Supplier Part Number 1: C2880408; Tolerance: ±10%; Voltage Rating: 25V; Temperature Coefficient: X5R; RoHS: Yes; ComponentLink1Description: Datasheet; ComponentLink1URL: https://wmsc.lcsc.com/wmsc/upload/file/pdf/v2/lcsc/2108160930_Taiyo-Yuden-TMK105BJ105KV-FD_C2880408.pdf; ComponentLink2Description: JLCPCB Part URL; ComponentLink2URL: https://jlcpcb.com/partdetail/C2880408; ComponentLink3Description: LCSC Part URL; ComponentLink3URL: https://lcsc.com/product-detail/Multilayer-Ceramic-Capacitors-MLCC---SMD-SMT_Taiyo-Yuden-Taiyo-Yuden-TMK105BJ105KV-FD_C2880408.html
footprint CAP-0402 (0402 (1005M) Capacitor)
pins: 1, 2

## TMK105CBJ225KV-F
designator C?  Capacitance: 2.2uF  (hidden comment: *)
Capacitor, Ceramic (MLCC), 2.2uF, ±10%, 25V, X5R, ±10%, SMD 0402; Manufacturer: Taiyo Yuden; Manufacturer Part Number: TMK105CBJ225KV-F; Package Size: 0402; JLCPCB Basic Part: No; JLCPCB Part Number: C386077; Supplier 1: LCSC; Category: Capacitors - MLCC; Supplier Part Number 1: C386077; Tolerance: ±10%; Voltage Rating: 25V; Temperature Coefficient: X5R; RoHS: Yes; ComponentLink1Description: Datasheet; ComponentLink1URL: https://wmsc.lcsc.com/wmsc/upload/file/pdf/v2/lcsc/2108160930_Taiyo-Yuden-TMK105CBJ225KV-F_C386077.pdf; ComponentLink2Description: JLCPCB Part URL; ComponentLink2URL: https://jlcpcb.com/partdetail/C386077; ComponentLink3Description: LCSC Part URL; ComponentLink3URL: https://lcsc.com/product-detail/Multilayer-Ceramic-Capacitors-MLCC---SMD-SMT_Taiyo-Yuden-Taiyo-Yuden-TMK105CBJ225KV-F_C386077.html
footprint CAP-0402 (0402 (1005M) Capacitor)
pins: 1, 2

## TMK105CBJ225MV-F
designator C?  Capacitance: 2.2uF  (hidden comment: *)
Capacitor, Ceramic (MLCC), 2.2uF, ±20%, 25V, X5R, ±20%, SMD 0402; Manufacturer: Taiyo Yuden; Manufacturer Part Number: TMK105CBJ225MV-F; Package Size: 0402; JLCPCB Basic Part: No; JLCPCB Part Number: C386078; Supplier 1: LCSC; Category: Capacitors - MLCC; Supplier Part Number 1: C386078; Tolerance: ±20%; Voltage Rating: 25V; Temperature Coefficient: X5R; RoHS: Yes; ComponentLink1Description: Datasheet; ComponentLink1URL: https://wmsc.lcsc.com/wmsc/upload/file/pdf/v2/lcsc/2108160930_Taiyo-Yuden-TMK105CBJ225MV-F_C386078.pdf; ComponentLink2Description: JLCPCB Part URL; ComponentLink2URL: https://jlcpcb.com/partdetail/C386078; ComponentLink3Description: LCSC Part URL; ComponentLink3URL: https://lcsc.com/product-detail/Multilayer-Ceramic-Capacitors-MLCC---SMD-SMT_Taiyo-Yuden-Taiyo-Yuden-TMK105CBJ225MV-F_C386078.html
footprint CAP-0402 (0402 (1005M) Capacitor)
pins: 1, 2

## TMK105SD122JV-F
designator C?  Capacitance: 1.2nF  (hidden comment: *)
Capacitor, Ceramic (MLCC), 1.2nF, ±5%, 25V, ±5%, SMD 0402; Manufacturer: Taiyo Yuden; Manufacturer Part Number: TMK105SD122JV-F; Package Size: 0402; JLCPCB Basic Part: No; JLCPCB Part Number: C524946; Supplier 1: LCSC; Category: Capacitors - MLCC; Supplier Part Number 1: C524946; Tolerance: ±5%; Voltage Rating: 25V; RoHS: Yes; ComponentLink1Description: Datasheet; ComponentLink1URL: https://wmsc.lcsc.com/wmsc/upload/file/pdf/v2/lcsc/2211282200_Taiyo-Yuden-TMK105SD122JV-F_C524946.pdf; ComponentLink2Description: JLCPCB Part URL; ComponentLink2URL: https://jlcpcb.com/partdetail/C524946; ComponentLink3Description: LCSC Part URL; ComponentLink3URL: https://lcsc.com/product-detail/Multilayer-Ceramic-Capacitors-MLCC---SMD-SMT_Taiyo-Yuden-Taiyo-Yuden-TMK105SD122JV-F_C524946.html
footprint CAP-0402 (0402 (1005M) Capacitor)
pins: 1, 2

## UMF105B7103KVHF
designator C?  Capacitance: 10nF  (hidden comment: *)
Capacitor, Ceramic (MLCC), 10nF, ±10%, 50V, X7R, ±10%, SMD 0402; Manufacturer: Taiyo Yuden; Manufacturer Part Number: UMF105B7103KVHF; Package Size: 0402; JLCPCB Basic Part: No; JLCPCB Part Number: C386105; Supplier 1: LCSC; Category: Capacitors - MLCC; Supplier Part Number 1: C386105; Tolerance: ±10%; Voltage Rating: 50V; Temperature Coefficient: X7R; RoHS: Yes; ComponentLink1Description: Datasheet; ComponentLink1URL: https://wmsc.lcsc.com/wmsc/upload/file/pdf/v2/lcsc/1912111437_Taiyo-Yuden-UMF105B7103KVHF_C386105.pdf; ComponentLink2Description: JLCPCB Part URL; ComponentLink2URL: https://jlcpcb.com/partdetail/C386105; ComponentLink3Description: LCSC Part URL; ComponentLink3URL: https://lcsc.com/product-detail/Multilayer-Ceramic-Capacitors-MLCC---SMD-SMT_Taiyo-Yuden-Taiyo-Yuden-UMF105B7103KVHF_C386105.html
footprint CAP-0402 (0402 (1005M) Capacitor)
pins: 1, 2

## UMK105ABJ474KV-F
designator C?  Capacitance: 470nF  (hidden comment: *)
Capacitor, Ceramic (MLCC), 470nF, ±10%, 50V, X5R, ±10%, SMD 0402; Manufacturer: Taiyo Yuden; Manufacturer Part Number: UMK105ABJ474KV-F; Package Size: 0402; JLCPCB Basic Part: No; JLCPCB Part Number: C386109; Supplier 1: LCSC; Category: Capacitors - MLCC; Supplier Part Number 1: C386109; Tolerance: ±10%; Voltage Rating: 50V; Temperature Coefficient: X5R; RoHS: Yes; ComponentLink1Description: Datasheet; ComponentLink1URL: https://wmsc.lcsc.com/wmsc/upload/file/pdf/v2/lcsc/2211282230_Taiyo-Yuden-UMK105ABJ474KV-F_C386109.pdf; ComponentLink2Description: JLCPCB Part URL; ComponentLink2URL: https://jlcpcb.com/partdetail/C386109; ComponentLink3Description: LCSC Part URL; ComponentLink3URL: https://lcsc.com/product-detail/Multilayer-Ceramic-Capacitors-MLCC---SMD-SMT_Taiyo-Yuden-Taiyo-Yuden-UMK105ABJ474KV-F_C386109.html
footprint CAP-0402 (0402 (1005M) Capacitor)
pins: 1, 2

## UMK105B7102KVHF
designator C?  Capacitance: 1nF  (hidden comment: *)
Capacitor, Ceramic (MLCC), 1nF, ±10%, 50V, X7R, ±10%, SMD 0402; Manufacturer: Taiyo Yuden; Manufacturer Part Number: UMK105B7102KVHF; Package Size: 0402; JLCPCB Basic Part: No; JLCPCB Part Number: C386110; Supplier 1: LCSC; Category: Capacitors - MLCC; Supplier Part Number 1: C386110; Tolerance: ±10%; Voltage Rating: 50V; Temperature Coefficient: X7R; RoHS: Yes; ComponentLink1Description: Datasheet; ComponentLink1URL: https://wmsc.lcsc.com/wmsc/upload/file/pdf/v2/lcsc/2304140030_Taiyo-Yuden-UMK105B7102KVHF_C386110.pdf; ComponentLink2Description: JLCPCB Part URL; ComponentLink2URL: https://jlcpcb.com/partdetail/C386110; ComponentLink3Description: LCSC Part URL; ComponentLink3URL: https://lcsc.com/product-detail/Multilayer-Ceramic-Capacitors-MLCC---SMD-SMT_Taiyo-Yuden-Taiyo-Yuden-UMK105B7102KVHF_C386110.html
footprint CAP-0402 (0402 (1005M) Capacitor)
pins: 1, 2

## UMK105B7103KVHF
designator C?  Capacitance: 10nF  (hidden comment: *)
Capacitor, Ceramic (MLCC), 10nF, ±10%, 50V, X7R, ±10%, SMD 0402; Manufacturer: Taiyo Yuden; Manufacturer Part Number: UMK105B7103KVHF; Package Size: 0402; JLCPCB Basic Part: No; JLCPCB Part Number: C386111; Supplier 1: LCSC; Category: Capacitors - MLCC; Supplier Part Number 1: C386111; Tolerance: ±10%; Voltage Rating: 50V; Temperature Coefficient: X7R; RoHS: Yes; ComponentLink1Description: Datasheet; ComponentLink1URL: https://wmsc.lcsc.com/wmsc/upload/file/pdf/v2/lcsc/1912111437_Taiyo-Yuden-UMK105B7103KVHF_C386111.pdf; ComponentLink2Description: JLCPCB Part URL; ComponentLink2URL: https://jlcpcb.com/partdetail/C386111; ComponentLink3Description: LCSC Part URL; ComponentLink3URL: https://lcsc.com/product-detail/Multilayer-Ceramic-Capacitors-MLCC---SMD-SMT_Taiyo-Yuden-Taiyo-Yuden-UMK105B7103KVHF_C386111.html
footprint CAP-0402 (0402 (1005M) Capacitor)
pins: 1, 2

## UMK105B7104KV-FR
designator C?  Capacitance: 100nF  (hidden comment: *)
Capacitor, Ceramic (MLCC), 100nF, ±10%, 50V, X7R, ±10%, SMD 0402; Manufacturer: Taiyo Yuden; Manufacturer Part Number: UMK105B7104KV-FR; Package Size: 0402; JLCPCB Basic Part: No; JLCPCB Part Number: C2167491; Supplier 1: LCSC; Category: Capacitors - MLCC; Supplier Part Number 1: C2167491; Tolerance: ±10%; Voltage Rating: 50V; Temperature Coefficient: X7R; RoHS: Yes; ComponentLink1Description: Datasheet; ComponentLink1URL: https://wmsc.lcsc.com/wmsc/upload/file/pdf/v2/lcsc/2211282030_Taiyo-Yuden-UMK105B7104KV-FR_C2167491.pdf; ComponentLink2Description: JLCPCB Part URL; ComponentLink2URL: https://jlcpcb.com/partdetail/C2167491; ComponentLink3Description: LCSC Part URL; ComponentLink3URL: https://lcsc.com/product-detail/Multilayer-Ceramic-Capacitors-MLCC---SMD-SMT_Taiyo-Yuden-Taiyo-Yuden-UMK105B7104KV-FR_C2167491.html
footprint CAP-0402 (0402 (1005M) Capacitor)
pins: 1, 2

## UMK105B7104KVHF
designator C?  Capacitance: 100nF  (hidden comment: *)
Capacitor, Ceramic (MLCC), 100nF, ±10%, 50V, X7R, ±10%, SMD 0402; Manufacturer: Taiyo Yuden; Manufacturer Part Number: UMK105B7104KVHF; Package Size: 0402; JLCPCB Basic Part: No; JLCPCB Part Number: C386112; Supplier 1: LCSC; Category: Capacitors - MLCC; Supplier Part Number 1: C386112; Tolerance: ±10%; Voltage Rating: 50V; Temperature Coefficient: X7R; RoHS: Yes; ComponentLink1Description: Datasheet; ComponentLink1URL: https://wmsc.lcsc.com/wmsc/upload/file/pdf/v2/lcsc/1912111437_Taiyo-Yuden-UMK105B7104KVHF_C386112.pdf; ComponentLink2Description: JLCPCB Part URL; ComponentLink2URL: https://jlcpcb.com/partdetail/C386112; ComponentLink3Description: LCSC Part URL; ComponentLink3URL: https://lcsc.com/product-detail/Multilayer-Ceramic-Capacitors-MLCC---SMD-SMT_Taiyo-Yuden-Taiyo-Yuden-UMK105B7104KVHF_C386112.html
footprint CAP-0402 (0402 (1005M) Capacitor)
pins: 1, 2

## UMK105B7152KVHF
designator C?  Capacitance: 1.5nF  (hidden comment: *)
Capacitor, Ceramic (MLCC), 1.5nF, ±10%, 50V, X7R, ±10%, SMD 0402; Manufacturer: Taiyo Yuden; Manufacturer Part Number: UMK105B7152KVHF; Package Size: 0402; JLCPCB Basic Part: No; JLCPCB Part Number: C650949; Supplier 1: LCSC; Category: Capacitors - MLCC; Supplier Part Number 1: C650949; Tolerance: ±10%; Voltage Rating: 50V; Temperature Coefficient: X7R; RoHS: Yes; ComponentLink1Description: Datasheet; ComponentLink1URL: https://wmsc.lcsc.com/wmsc/upload/file/pdf/v2/lcsc/2304140030_Taiyo-Yuden-UMK105B7152KVHF_C650949.pdf; ComponentLink2Description: JLCPCB Part URL; ComponentLink2URL: https://jlcpcb.com/partdetail/C650949; ComponentLink3Description: LCSC Part URL; ComponentLink3URL: https://lcsc.com/product-detail/Multilayer-Ceramic-Capacitors-MLCC---SMD-SMT_Taiyo-Yuden-Taiyo-Yuden-UMK105B7152KVHF_C650949.html
footprint CAP-0402 (0402 (1005M) Capacitor)
pins: 1, 2
